# Altium footprint library Mylib.PcbLib: 320 footprints (part 17 of 20)
Each footprint in its own frame and in the unit in brackets; x right, y up, seen from the top. Pads: shape width x height; smd on the part's side, far side on the other; paste and mask are expansions set on the pad; w line width, h text height; cw(c..) or ccw(c..) is an arc to the next point about the centre after c.
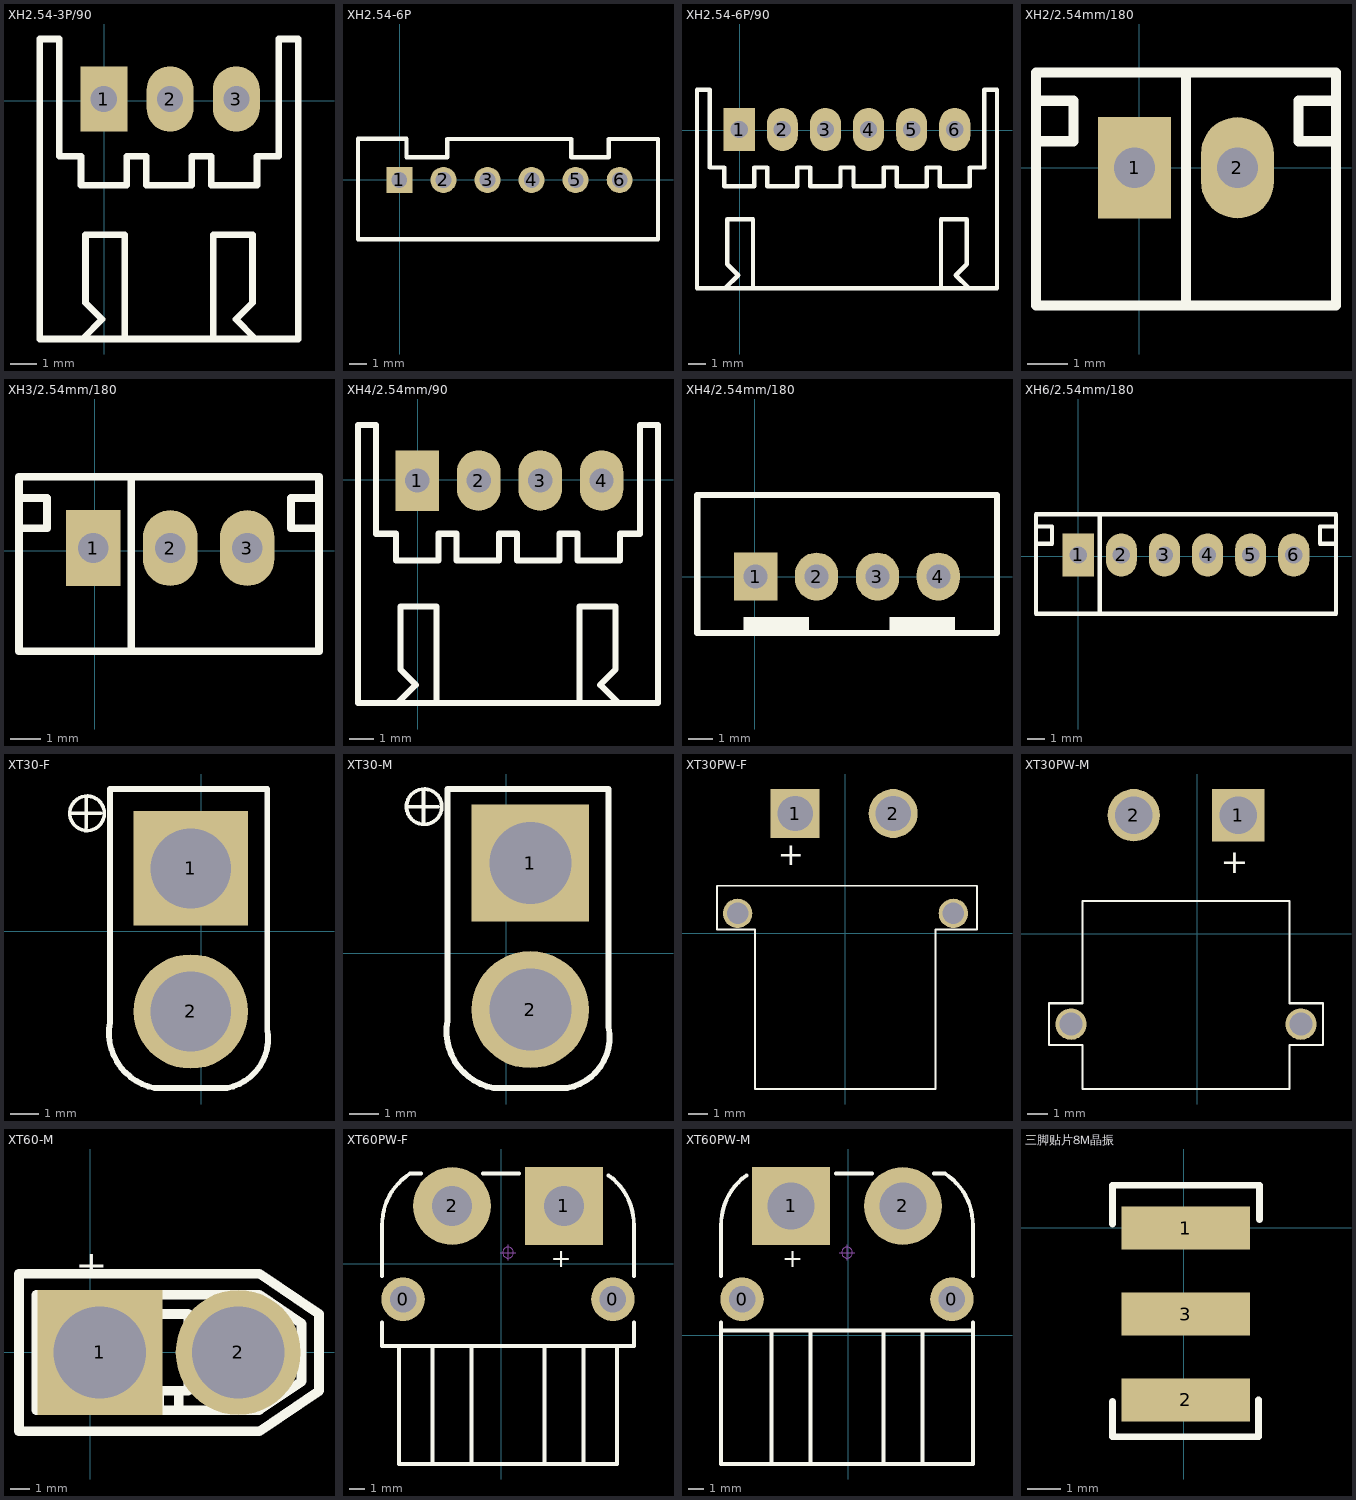
[diagram p16: the footprints below, top view; thin cyan lines are the x and y axes]

## XH2.54-3P/90 [mm]
pads (3):
  rect 1.8x2.5 hole 1: 1(-0.02,0.065)
  oval 1.8x2.5 hole 1: 2(2.52,0.065) 3(5.06,0.065)
Top Overlay:
  lines w0.254: -0.81,-9.107 -0.083,-8.381 -0.72,-7.744 -0.72,-5.135 0.78,-5.135 0.78,-9.135 ; 4.18,-9.135 4.18,-5.135 5.68,-5.135 5.68,-7.744 5.044,-8.381 5.77,-9.107 ; -2.47,-9.135 7.43,-9.135 7.43,2.365 6.68,2.365 6.68,-2.135 5.855,-2.135 5.855,-3.235 4.105,-3.235 4.105,-2.135 3.355,-2.135 3.355,-3.235 1.605,-3.235 1.605,-2.135 0.855,-2.135 0.855,-3.235 -0.895,-3.235 -0.895,-2.135 -1.72,-2.135 -1.72,2.365 -2.47,2.365 -2.47,-9.135
3D body "JST-S3B-XH-A.STEP": height 6.1, standoff -3.4, extent -2.47,-9.135 7.43,2.365

## XH2.54-6P [mm]
pads (6):
  rect 1.5x1.5 hole 0.9: 1(-0.018,-0.022)
  round 1.5 hole 0.9: 2(2.522,-0.022) 3(5.062,-0.022) 4(7.602,-0.022) 5(10.142,-0.022) 6(12.682,-0.022)
Top Overlay:
  lines w0.254: -2.406,-3.451 -2.406,2.366 0.388,2.366 0.388,1.299 2.75,1.299 2.75,2.34 9.888,2.34 9.888,1.299 12.047,1.299 12.047,2.34 14.891,2.34 14.891,-3.451 -2.406,-3.451
3D body "6pin-2.5.step": height 7, standoff -3.4, extent -2.495,-3.405 14.905,2.345

## XH2.54-6P/90 [mm]
pads (6):
  rect 1.8x2.5 hole 1: 1(-0.015,0.035)
  oval 1.8x2.5 hole 1: 2(2.485,0.035) 3(4.985,0.035) 4(7.485,0.035) 5(9.985,0.035) 6(12.485,0.035)
Top Overlay:
  lines w0.254: -0.805,-9.137 -0.079,-8.41 -0.715,-7.774 -0.715,-5.165 0.785,-5.165 0.785,-9.165 ; 11.685,-9.165 11.685,-5.165 13.185,-5.165 13.185,-7.774 12.548,-8.41 13.275,-9.137 ; -2.465,-9.165 14.935,-9.165 14.935,2.335 14.185,2.335 14.185,-2.165 13.36,-2.165 13.36,-3.265 11.61,-3.265 11.61,-2.165 10.86,-2.165 10.86,-3.265 9.11,-3.265 9.11,-2.165 8.36,-2.165 8.36,-3.265 6.61,-3.265 6.61,-2.165 5.86,-2.165 5.86,-3.265 4.11,-3.265 4.11,-2.165 3.36,-2.165 3.36,-3.265 1.61,-3.265 1.61,-2.165 0.86,-2.165 0.86,-3.265 -0.89,-3.265 -0.89,-2.165 -1.715,-2.165 -1.715,2.335 -2.465,2.335 -2.465,-9.165
3D body "JST-S6B-XH-A.STEP": height 6.1, standoff -3.4, extent -2.465,-9.165 14.935,2.335

## XH2/2.54mm/180 [mm]
pads (2):
  rect 1.8x2.5 hole 1: 1(-0.12,0)
  oval 1.8x2.5 hole 1: 2(2.42,0)
Top Overlay:
  lines w0.254: -2.55,0.65 -1.624,0.65 -1.624,1.65 -2.55,1.65 ; 1.15,-3.4 1.15,2.35 ; 4.85,0.65 3.924,0.65 3.924,1.65 4.85,1.65 ; -2.55,-3.4 -2.55,2.35 4.85,2.35 4.85,-3.4 -2.55,-3.4
3D body "JST-B2B-XH-A.STEP": height 7, standoff -3.4, extent -2.55,-3.4 4.85,2.35

## XH3/2.54mm/180 [mm]
pads (3):
  rect 1.8x2.5 hole 1: 1(-0.045,0.08)
  oval 1.8x2.5 hole 1: 2(2.495,0.08) 3(5.035,0.08)
Top Overlay:
  lines w0.254: -2.495,0.73 -1.569,0.73 -1.569,1.73 -2.495,1.73 ; 1.205,-3.32 1.205,2.43 ; 7.405,0.73 6.479,0.73 6.479,1.73 7.405,1.73 ; -2.495,-3.32 -2.495,2.43 7.405,2.43 7.405,-3.32 -2.495,-3.32
3D body "JST-B3B-XH-A.STEP": height 7, standoff -3.4, extent -2.495,-3.32 7.405,2.43

## XH4/2.54mm/90 [mm]
pads (4):
  rect 1.8x2.5 hole 1: 1(-0.015,-0.035)
  oval 1.8x2.5 hole 1: 2(2.525,-0.035) 3(5.065,-0.035) 4(7.605,-0.035)
Top Overlay:
  lines w0.254: -0.805,-9.207 -0.079,-8.481 -0.715,-7.844 -0.715,-5.235 0.785,-5.235 0.785,-9.235 ; 6.685,-9.235 6.685,-5.235 8.185,-5.235 8.185,-7.844 7.548,-8.481 8.275,-9.207 ; -2.465,-9.235 9.935,-9.235 9.935,2.265 9.185,2.265 9.185,-2.235 8.36,-2.235 8.36,-3.335 6.61,-3.335 6.61,-2.235 5.86,-2.235 5.86,-3.335 4.11,-3.335 4.11,-2.235 3.36,-2.235 3.36,-3.335 1.61,-3.335 1.61,-2.235 0.86,-2.235 0.86,-3.335 -0.89,-3.335 -0.89,-2.235 -1.715,-2.235 -1.715,2.265 -2.465,2.265 -2.465,-9.235
3D body "JST-S4B-XH-A.STEP": height 6.1, standoff -3.4, extent -2.465,-9.235 9.935,2.265

## XH4/2.54mm/180 [mm]
pads (4):
  rect 1.8x2 hole 1: 1(0.045,0.005)
  oval 1.8x2 hole 1: 2(2.585,0.005) 3(5.125,0.005) 4(7.665,0.005)
Top Overlay:
  region: 2.273,-1.687 -0.463,-1.687 -0.463,-2.337 2.273,-2.337
  region: 8.369,-1.687 5.633,-1.687 5.633,-2.337 8.369,-2.337
  lines w0.24: 10.115,-2.345 10.115,0.005
  lines w0.254: -2.393,-2.32 -2.393,3.405 ; 10.115,0.005 10.115,3.405 ; -2.405,-2.345 10.115,-2.345 ; -2.405,-2.345 -2.405,3.405 ; -2.405,-2.345 -2.405,0.005 -2.405,3.405 ; -2.405,3.405 10.115,3.405 ; 10.115,-2.345 10.115,-2.345 ; 10.115,-2.345 10.115,3.405
3D body "User Library-B4B-XH-A.STEP": height 7, standoff -3.4, extent -2.345,-2.443 10.055,3.307

## XH6/2.54mm/180 [mm]
pads (6):
  rect 1.8x2.5 hole 1: 1(0.01,0.08)
  oval 1.8x2.5 hole 1: 2(2.51,0.08) 3(5.01,0.08) 4(7.51,0.08) 5(10.01,0.08) 6(12.51,0.08)
Top Overlay:
  lines w0.254: -2.44,0.73 -1.514,0.73 -1.514,1.73 -2.44,1.73 ; 1.26,-3.32 1.26,2.43 ; 14.96,0.73 14.034,0.73 14.034,1.73 14.96,1.73 ; -2.44,-3.32 -2.44,2.43 14.96,2.43 14.96,-3.32 -2.44,-3.32
3D body "JST-B6B-XH-A.STEP": height 7, standoff -3.4, extent -2.44,-3.32 14.96,2.43

## XT30-F [mm]
pads (2):
  rect 4x4 hole 2.8: 1(-0.375,2.2)
  round 4 hole 2.8: 2(-0.375,-2.8)
Top Overlay:
  circle w0.127: c-3.997,4.125 r0.604
  lines w0.127: -4.53,4.125 -3.514,4.125 ; -4.022,3.617 -4.022,4.633
  lines w0.2: -3.2,-1.142 -3.2,4.975 ; -3.2,4.975 -3.2,-3.184 ccw(c-1.27,-3.545) -1.631,-5.475 0.889,-5.475 ccw(c0.565,-3.74) 2.3,-3.415 2.299,4.975 -3.2,4.975
Mechanical 15:
  lines w0.05: -0.037,-5.417 0.963,-5.417
3D body "User Library-xt30-f.step": height 9.4, standoff -3, extent -3.025,-5.4 2.175,4.8

## XT30-M [mm]
pads (2):
  rect 4x4 hole 2.8: 1(0.825,3.075)
  round 4 hole 2.8: 2(0.825,-1.925)
Top Overlay:
  circle w0.127: c-2.797,5 r0.604
  lines w0.127: -3.33,5 -2.314,5 ; -2.822,4.492 -2.822,5.508
  lines w0.2: -2,-0.267 -2,5.6 ; -2,5.6 -2,-2.309 ccw(c-0.07,-2.67) -0.431,-4.6 2.089,-4.6 ccw(c1.765,-2.865) 3.5,-2.54 3.499,5.6 -2,5.6
Mechanical 15:
  lines w0.05: 1.163,-4.542 2.163,-4.542
3D body "User Library-XT30.step": height 12.6, standoff -2.9, extent -1.9,-4.8 3.4,5.6

## XT30PW-F [mm] "母头"
pads (4):
  rect 2.5x2.5 hole 1.8: 1(-2.566,6.095)
  round 2.5 hole 1.8: 2(2.434,6.095)
  round 1.5 hole 1.1: ""(-5.5,1) ""(5.5,1)
Top Overlay:
  lines w0.1: -6.55,0.178 -4.623,0.178 -4.623,-7.95 4.597,-7.95 4.597,0.178 6.706,0.178 6.706,2.413 4.95,2.413 -4.95,2.413 -6.55,2.413 -6.55,0.178
  text "+" at -2.108,4.826 h2
3D body "User Library-XT30PW-F.STEP": height 5, standoff -2, extent -6.55,-7.95 6.75,6.95

## XT30PW-M [mm] "公头"
pads (4):
  rect 2.5x2.5 hole 1.8: 1(1.959,5.673)
  round 2.5 hole 1.8: 2(-3.041,5.673)
  round 1.5 hole 1.1: ""(-6.041,-4.327) ""(4.959,-4.327)
Top Overlay:
  lines w0.1: -7.091,-5.327 -7.091,-3.327 -5.491,-3.327 -5.491,1.573 4.409,1.573 4.409,-3.327 6.009,-3.327 6.009,-5.327 4.409,-5.327 4.409,-7.427 -5.491,-7.427 -5.491,-5.327 -7.091,-5.327
  text "+" at 2.472,4.267 h2
3D body "User Library-XT30PW-M.STEP": height 5, standoff -2, extent -7.153,-7.381 6.147,6.569

## XT60-M [mm] "公头"
pads (2):
  rect 6.5x6.5 hole 4.8: 1(0.489,0)
  round 6.5 hole 4.8: 2(7.689,0)
Top Overlay:
  lines w0.5: 3.048,-3 -2.819,-3 ; 3.589,-3 3.589,-2 4.589,-2 4.589,-3 ; 5.089,-3 8.791,-3 -2.819,-3 ; 8.791,-3.001 10.982,-1.5 10.982,1.5 8.791,3.001 -2.819,3 -2.819,-3 ; -3.711,-4.1 -3.711,4.1 8.788,4.1 11.889,2 11.889,-2 8.788,-4.1 -3.711,-4.1 ; 3.089,-2 5.089,-2 5.089,2 3.089,2 3.089,-2
  text "+" at 0.9,5.6 h2.5
3D body "XT60H male.STEP": height 16.5, standoff -4.7, extent -3.81,-4.064 12.09,4.086

## XT60PW-F [mm] "母头"
pads (4):
  round 2.8 hole 1.7: 0(-6.305,-2.268) 0(7.195,-2.268)
  rect 5x5 hole 2.6: 1(4.045,3.732)
  round 5 hole 2.6: 2(-3.155,3.732)
Top Overlay:
  lines w0.254: -7.655,-3.768 -7.655,-5.268 8.545,-5.268 8.545,-3.768 ; -7.655,-0.768 -7.655,2.47 cw(c-3.755,2.532) -5.849,5.823 ; -6.555,-5.268 -6.555,-12.868 7.445,-12.868 7.445,-5.268 ; -5.849,5.832 -5.155,5.832 ; -4.405,-12.868 -4.405,-5.268 ; -1.905,-12.868 -1.905,-5.268 ; -1.155,5.832 1.145,5.832 ; 2.795,-12.868 2.795,-5.268 ; 5.295,-12.868 5.295,-5.268 ; 6.921,5.699 cw(c4.645,2.532) 8.545,2.47 ; 8.545,-0.768 8.545,2.524 ; 0.445,-5.268 ccw(c0.445,-5.268) 0.445,-5.268
  text "+" at 4.555,1.194 h2
Mechanical 15:
  circle w0.05: c0.445,0.732 r0.35
  lines w0.05: -0.055,0.732 0.945,0.732 ; 0.445,0.232 0.445,1.232
3D body "TX60PW-F20.STEP": height 8.65, standoff -2.35, extent -7.555,-12.868 8.445,5.752

## XT60PW-M [mm] "公头"
pads (4):
  round 2.8 hole 1.7: 0(-6.83,2.326) 0(6.67,2.326)
  rect 5x5 hole 3: 1(-3.68,8.326)
  round 5 hole 3: 2(3.52,8.326)
Top Overlay:
  lines w0.254: -8.18,0.826 -8.18,0.326 ; -8.18,3.826 -8.18,7.118 ; -8.18,7.065 cw(c-4.28,7.126) -6.556,10.294 ; -4.93,-8.274 -4.93,0.326 ; -2.43,-8.274 -2.43,0.326 ; -0.78,10.426 1.52,10.426 ; 2.27,-8.274 2.27,0.326 ; 4.77,-8.274 4.77,0.326 ; 5.52,10.426 6.214,10.426 ; 6.214,10.417 cw(c4.12,7.126) 8.02,7.065 8.02,3.826 ; 8.02,0.826 8.02,0.326 ; -8.18,0.326 8.02,0.326 ; -8.18,0.326 -8.18,-8.274 8.02,-8.274 8.02,0.326
  text "+" at -2.888,5.791 h2
Mechanical 15:
  circle w0.05: c-0.08,5.326 r0.35
  lines w0.05: -0.58,5.326 0.42,5.326 ; -0.08,4.826 -0.08,5.826
3D body "User Library-XT60IPW-M--3DModel-STEP-56544.step": height 4.2, standoff -6.75, extent -7.804,-8.1 7.696,9.5

## 三脚贴片8M晶振 [mm] "CSTCC8M00G53-RO"
pads (3):
  rect 3.8x1.27 smd: 1(0.06,-0.006) 2(0.06,-5.086) 3(0.06,-2.546)
Top Overlay:
  lines w0.203: -2.099,-5.137 -2.099,-6.178 2.219,-6.178 2.219,-5.086 ; -2.099,0.121 -2.099,1.264 2.244,1.264 2.244,0.248
3D body: height 1.5, standoff 0.1, extent -1.718,-6.229 1.838,1.264